# Altium footprint library UP-ROBOT Connectors(2013-02-26).PcbLib: 121 footprints (part 3 of 8)
Each footprint in its own frame and in the unit in brackets; x right, y up, seen from the top. Pads: shape width x height; smd on the part's side, far side on the other; paste and mask are expansions set on the pad; w line width, h text height; cw(c..) or ccw(c..) is an arc to the next point about the centre after c.
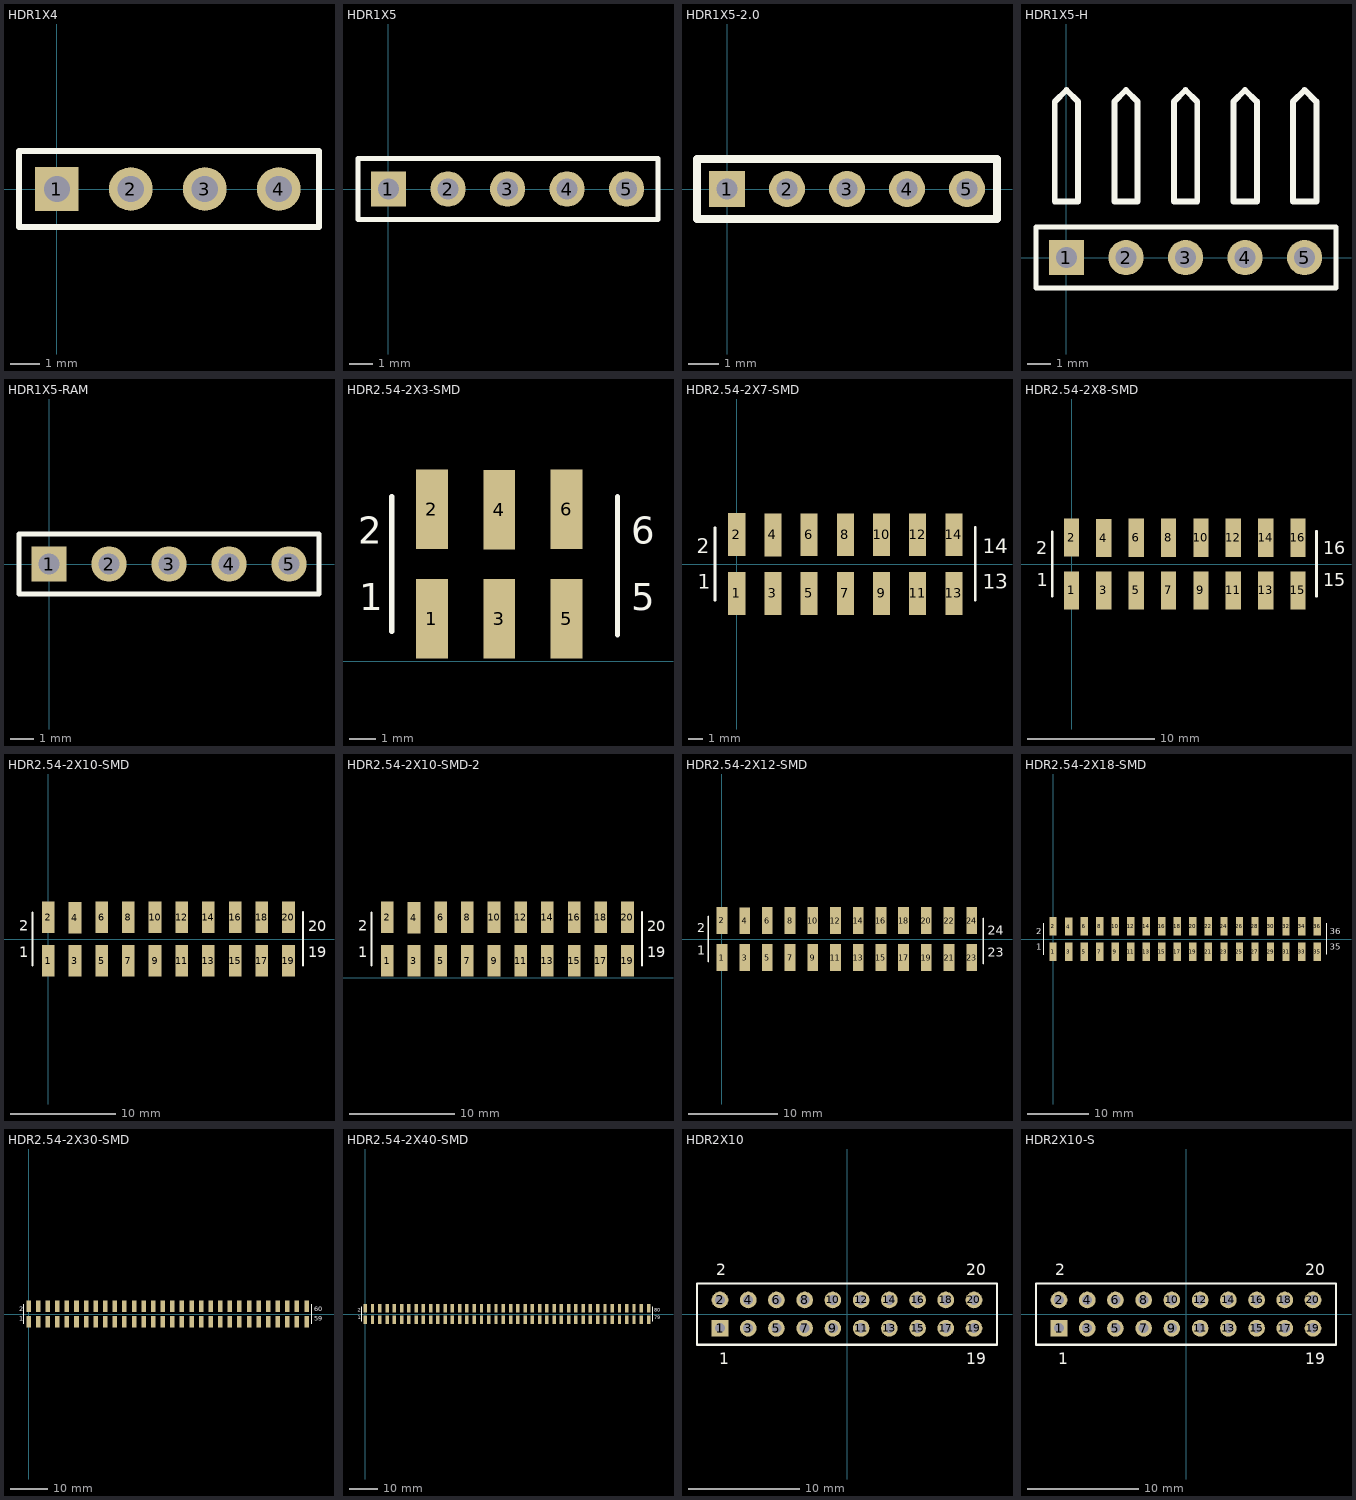
[diagram p2: the footprints below, top view; thin cyan lines are the x and y axes]

## HDR1X4 [mm]
pads (4):
  rect 1.5x1.5 hole 0.9: 1(0,0)
  round 1.5 hole 0.9: 2(2.54,0) 3(5.08,0) 4(7.62,0)
Top Overlay:
  lines w0.203: -1.3,-1.3 -1.3,1.3 9,1.3 9,-1.3 -1.3,-1.3

## HDR1X5 [mm]
pads (5):
  rect 1.5x1.5 hole 0.9: 1(0,0)
  round 1.5 hole 0.9: 2(2.54,0) 3(5.08,0) 4(7.62,0) 5(10.16,0)
Top Overlay:
  lines w0.203: -1.3,-1.3 -1.3,1.3 11.5,1.3 11.5,-1.3 -1.3,-1.3
3D body: height 9.04, standoff -3, extent -1.2,-1.2 11.5,1.34

## HDR1X5-2.0 [mm]
pads (5):
  rect 1.2x1.2 hole 0.7: 1(0,0)
  round 1.2 hole 0.7: 2(2,0) 3(4,0) 4(6,0) 5(8,0)
Top Overlay:
  lines w0.254: -1,-1 -1,1 9,1 9,-1 -1,-1

## HDR1X5-H [mm]
pads (5):
  rect 1.5x1.5 hole 0.9: 1(0,0)
  round 1.5 hole 0.9: 2(2.54,0) 3(5.08,0) 4(7.62,0) 5(10.16,0)
Top Overlay:
  lines w0.203: -1.3,-1.3 -1.3,1.3 11.5,1.3 11.5,-1.3 -1.3,-1.3
  lines w0.254: -0.5,2.4 0.5,2.4 0.5,6.65 0,7.15 -0.5,6.65 -0.5,2.4 ; 2.04,2.4 3.04,2.4 3.04,6.65 2.54,7.15 2.04,6.65 2.04,2.4 ; 4.58,2.4 5.58,2.4 5.58,6.65 5.08,7.15 4.58,6.65 4.58,2.4 ; 7.12,2.4 8.12,2.4 8.12,6.65 7.62,7.15 7.12,6.65 7.12,2.4 ; 9.66,2.4 9.66,6.65 10.16,7.15 10.66,6.65 10.66,2.4 9.66,2.4
3D body: height 4.7, standoff -3, extent -1.225,-1.275 11.475,6.995

## HDR1X5-RAM [mm]
pads (5):
  rect 1.5x1.5 hole 0.9: 1(0,0)
  round 1.5 hole 0.9: 2(2.54,0) 3(5.08,0) 4(7.62,0) 5(10.16,0)
Top Overlay:
  lines w0.2: -1.27,-1.27 11.43,-1.27 11.43,1.27 -1.27,1.27 -1.27,-1.27
3D body: height 2.51, standoff -3, extent -1.28,-0.31 11.42,9.82

## HDR2.54-2X3-SMD [mm]
pads (6):
  rect 1.2x3 smd: 1(20,1.6) 2(20,5.74) 3(22.54,1.6) 4(22.54,5.71) 5(25.08,1.6) 6(25.08,5.73)
Top Overlay:
  lines w0.2: 18.48,1.13 18.48,6.21 ; 27,1 27,6.21
  text "5" at 27.515,1.92 h1.02
  text "6" at 27.515,4.432 h1.02
  text "2" at 17.21,4.432 h1.02
  text "1" at 17.25,1.92 h1.02

## HDR2.54-2X7-SMD [mm]
pads (14):
  rect 1.2x3 smd: 1(0,-2.07) 2(0,2.07) 3(2.54,-2.07) 4(2.54,2.04) 5(5.08,-2.07) 6(5.08,2.06) 7(7.62,-2.07) 8(7.62,2.06) 9(10.16,-2.07) 10(10.16,2.06) 11(12.7,-2.07) 12(12.7,2.06) 13(15.24,-2.07) 14(15.24,2.06)
Top Overlay:
  lines w0.2: -1.52,-2.54 -1.52,2.54 ; 16.735,-2.515 16.735,2.565
  text "13" at 17.25,-1.75 h1.02
  text "14" at 17.25,0.75 h1.02
  text "1" at -2.75,-1.75 h1.02
  text "2" at -2.79,0.762 h1.02

## HDR2.54-2X8-SMD [mm]
pads (16):
  rect 1.2x3 smd: 1(0,-2.07) 2(0,2.07) 3(2.54,-2.07) 4(2.54,2.04) 5(5.08,-2.07) 6(5.08,2.06) 7(7.62,-2.07) 8(7.62,2.06) 9(10.16,-2.07) 10(10.16,2.06) 11(12.7,-2.07) 12(12.7,2.06) 13(15.24,-2.07) 14(15.24,2.06) 15(17.78,-2.07) 16(17.78,2.06)
Top Overlay:
  lines w0.2: -1.52,-2.54 -1.52,2.54 ; 19.235,-2.515 19.235,2.565
  text "16" at 19.75,0.75 h1.02
  text "15" at 19.75,-1.75 h1.02
  text "1" at -2.75,-1.75 h1.02
  text "2" at -2.79,0.762 h1.02

## HDR2.54-2X10-SMD [mm]
pads (20):
  rect 1.2x3 smd: 1(0,-2.07) 2(0,2.07) 3(2.54,-2.07) 4(2.54,2.04) 5(5.08,-2.07) 6(5.08,2.06) 7(7.62,-2.07) 8(7.62,2.06) 9(10.16,-2.07) 10(10.16,2.06) 11(12.7,-2.07) 12(12.7,2.06) 13(15.24,-2.07) 14(15.24,2.06) 15(17.78,-2.07) 16(17.78,2.06) 17(20.32,-2.07) 18(20.32,2.06) 19(22.86,-2.07) 20(22.86,2.06)
Top Overlay:
  lines w0.2: -1.52,-2.54 -1.52,2.54 ; 24.235,-2.515 24.235,2.565
  text "19" at 24.75,-1.75 h1.02
  text "20" at 24.75,0.75 h1.02
  text "2" at -2.79,0.762 h1.02
  text "1" at -2.75,-1.75 h1.02

## HDR2.54-2X10-SMD-2 [mm]
pads (20):
  rect 1.2x3 smd: 1(16,1.63) 2(16,5.77) 3(18.54,1.63) 4(18.54,5.74) 5(21.08,1.63) 6(21.08,5.76) 7(23.62,1.63) 8(23.62,5.76) 9(26.16,1.63) 10(26.16,5.76) 11(28.7,1.63) 12(28.7,5.76) 13(31.24,1.63) 14(31.24,5.76) 15(33.78,1.63) 16(33.78,5.76) 17(36.32,1.63) 18(36.32,5.76) 19(38.86,1.63) 20(38.86,5.76)
Top Overlay:
  lines w0.2: 14.48,1.16 14.48,6.24 ; 40.235,1.185 40.235,6.265
  text "1" at 13.25,1.95 h1.02
  text "2" at 13.21,4.462 h1.02
  text "20" at 40.75,4.45 h1.02
  text "19" at 40.75,1.95 h1.02

## HDR2.54-2X12-SMD [mm]
pads (24):
  rect 1.2x3 smd: 1(0,-2.07) 2(0,2.07) 3(2.54,-2.07) 4(2.54,2.04) 5(5.08,-2.07) 6(5.08,2.06) 7(7.62,-2.07) 8(7.62,2.06) 9(10.16,-2.07) 10(10.16,2.06) 11(12.7,-2.07) 12(12.7,2.06) 13(15.24,-2.07) 14(15.24,2.06) 15(17.78,-2.07) 16(17.78,2.06) 17(20.32,-2.07) 18(20.32,2.06) 19(22.86,-2.07) 20(22.86,2.06) 21(25.4,-2.07) 22(25.4,2.06) 23(27.94,-2.07) 24(27.94,2.06)
Top Overlay:
  lines w0.2: -1.52,-2.54 -1.52,2.54 ; 29.235,-2.765 29.235,2.315
  text "24" at 29.75,0.5 h1.02
  text "23" at 29.75,-2 h1.02
  text "2" at -2.79,0.762 h1.02
  text "1" at -2.75,-1.75 h1.02

## HDR2.54-2X18-SMD [mm]
pads (36):
  rect 1.2x3 smd: 1(0,-2.07) 2(0,2.07) 3(2.54,-2.07) 4(2.54,2.04) 5(5.08,-2.07) 6(5.08,2.06) 7(7.62,-2.07) 8(7.62,2.06) 9(10.16,-2.07) 10(10.16,2.06) 11(12.7,-2.07) 12(12.7,2.06) 13(15.24,-2.07) 14(15.24,2.06) 15(17.78,-2.07) 16(17.78,2.06) 17(20.32,-2.07) 18(20.32,2.06) 19(22.86,-2.07) 20(22.86,2.06) 21(25.4,-2.07) 22(25.4,2.06) 23(27.94,-2.07) 24(27.94,2.06) 25(30.48,-2.07) 26(30.48,2.06) 27(33.02,-2.07) 28(33.02,2.06) 29(35.56,-2.07) 30(35.56,2.06) 31(38.1,-2.07) 32(38.1,2.06) 33(40.64,-2.07) 34(40.64,2.06) 35(43.18,-2.07) 36(43.18,2.06)
Top Overlay:
  lines w0.2: -1.52,-2.54 -1.52,2.54 ; 44.735,-2.515 44.735,2.565
  text "35" at 45.25,-1.75 h1.02
  text "36" at 45.25,0.75 h1.02
  text "2" at -2.79,0.762 h1.02
  text "1" at -2.75,-1.75 h1.02

## HDR2.54-2X30-SMD [mm]
pads (60):
  rect 1.2x3 smd: 1(0,-2.07) 2(0,2.07) 3(2.54,-2.07) 4(2.54,2.04) 5(5.08,-2.07) 6(5.08,2.06) 7(7.62,-2.07) 8(7.62,2.06) 9(10.16,-2.07) 10(10.16,2.06) 11(12.7,-2.07) 12(12.7,2.06) 13(15.24,-2.07) 14(15.24,2.06) 15(17.78,-2.07) 16(17.78,2.06) 17(20.32,-2.07) 18(20.32,2.06) 19(22.86,-2.07) 20(22.86,2.06) 21(25.4,-2.07) 22(25.4,2.06) 23(27.94,-2.07) 24(27.94,2.06) 25(30.48,-2.07) 26(30.48,2.06) 27(33.02,-2.07) 28(33.02,2.06) 29(35.56,-2.07) 30(35.56,2.06) 31(38.1,-2.07) 32(38.1,2.06) 33(40.64,-2.07) 34(40.64,2.06) 35(43.18,-2.07) 36(43.18,2.06) 37(45.72,-2.07) 38(45.72,2.06) 39(48.26,-2.07) 40(48.26,2.06) 41(50.8,-2.07) 42(50.8,2.06) 43(53.34,-2.07) 44(53.34,2.06) 45(55.88,-2.07) 46(55.88,2.06) 47(58.42,-2.07) 48(58.42,2.06) 49(60.96,-2.07) 50(60.96,2.06) 51(63.5,-2.07) 52(63.5,2.06) 53(66.04,-2.07) 54(66.04,2.06) 55(68.58,-2.07) 56(68.58,2.06) 57(71.12,-2.07) 58(71.12,2.06) 59(73.66,-2.07) 60(73.66,2.06)
Top Overlay:
  lines w0.2: -1.27,-2.54 -1.27,2.54 ; 75.06,-2.54 75.06,2.54
  text "2" at -2.54,0.762 h1.27
  text "1" at -2.54,-1.778 h1.27
  text "59" at 75.692,-1.778 h1.27
  text "60" at 75.692,0.762 h1.27

## HDR2.54-2X40-SMD [mm] "SOIC, 16-Leads, Body 10.6x7.7mm (max), Pitch 1.27mm, IPC Medium Density"
height 3.632
pads (80):
  rect 1.2x3 smd: 1(0,-2.07) 2(0,2.07) 3(2.54,-2.07) 4(2.54,2.04) 5(5.08,-2.07) 6(5.08,2.06) 7(7.62,-2.07) 8(7.62,2.06) 9(10.16,-2.07) 10(10.16,2.06) 11(12.7,-2.07) 12(12.7,2.06) 13(15.24,-2.07) 14(15.24,2.06) 15(17.78,-2.07) 16(17.78,2.06) 17(20.32,-2.07) 18(20.32,2.06) 19(22.86,-2.07) 20(22.86,2.06) 21(25.4,-2.07) 22(25.4,2.06) 23(27.94,-2.07) 24(27.94,2.06) 25(30.48,-2.07) 26(30.48,2.06) 27(33.02,-2.07) 28(33.02,2.06) 29(35.56,-2.07) 30(35.56,2.06) 31(38.1,-2.07) 32(38.1,2.06) 33(40.64,-2.07) 34(40.64,2.06) 35(43.18,-2.07) 36(43.18,2.06) 37(45.72,-2.07) 38(45.72,2.06) 39(48.26,-2.07) 40(48.26,2.06) 41(50.8,-2.07) 42(50.8,2.06) 43(53.34,-2.07) 44(53.34,2.06) 45(55.88,-2.07) 46(55.88,2.06) 47(58.42,-2.07) 48(58.42,2.06) 49(60.96,-2.07) 50(60.96,2.06) 51(63.5,-2.07) 52(63.5,2.06) 53(66.04,-2.07) 54(66.04,2.06) 55(68.58,-2.07) 56(68.58,2.06) 57(71.12,-2.07) 58(71.12,2.06) 59(73.66,-2.07) 60(73.66,2.06) 61(76.2,-2.07) 62(76.2,2.06) 63(78.74,-2.07) 64(78.74,2.06) 65(81.28,-2.07) 66(81.28,2.06) 67(83.82,-2.07) 68(83.82,2.06) 69(86.36,-2.07) 70(86.36,2.06) 71(88.9,-2.07) 72(88.9,2.06) 73(91.44,-2.07) 74(91.44,2.06) 75(93.98,-2.07) 76(93.98,2.06) 77(96.52,-2.07) 78(96.52,2.06) 79(99.06,-2.07) 80(99.06,2.06)
Top Overlay:
  lines w0.2: -1.27,-2.54 -1.27,2.54 ; 100.46,-2.54 100.46,2.54
  text "80" at 101.092,0.762 h1.27
  text "79" at 101.092,-1.778 h1.27
  text "2" at -2.54,0.762 h1.27
  text "1" at -2.54,-1.778 h1.27

## HDR2X10 [mm]
pads (20):
  rect 1.5x1.5 hole 0.9: 1(-11.43,-1.27)
  round 1.5 hole 0.9: 2(-11.43,1.27) 3(-8.89,-1.27) 4(-8.89,1.27) 5(-6.35,-1.27) 6(-6.35,1.27) 7(-3.81,-1.27) 8(-3.81,1.27) 9(-1.27,-1.27) 10(-1.27,1.27) 11(1.27,-1.27) 12(1.27,1.27) 13(3.81,-1.27) 14(3.81,1.27) 15(6.35,-1.27) 16(6.35,1.27) 17(8.89,-1.27) 18(8.89,1.27) 19(11.43,-1.27) 20(11.43,1.27)
Top Overlay:
  lines w0.203: -13.5,-2.75 -13.5,2.75 0,2.75 13.5,2.75 13.5,-2.75 -13.5,-2.75
  text "1" at -11.5,-4.5 h1.02
  text "19" at 10.75,-4.5 h1.02
  text "20" at 10.75,3.5 h1.02
  text "2" at -11.75,3.5 h1.02
3D body: height 9.04, standoff -3, extent -12.7,-2.58 12.7,2.5

## HDR2X10-S [mm]
pads (20):
  rect 1.5x1.5 hole 0.9: 1(-11.43,-1.27)
  round 1.5 hole 0.9: 2(-11.43,1.27) 3(-8.89,-1.27) 4(-8.89,1.27) 5(-6.35,-1.27) 6(-6.35,1.27) 7(-3.81,-1.27) 8(-3.81,1.27) 9(-1.27,-1.27) 10(-1.27,1.27) 11(1.27,-1.27) 12(1.27,1.27) 13(3.81,-1.27) 14(3.81,1.27) 15(6.35,-1.27) 16(6.35,1.27) 17(8.89,-1.27) 18(8.89,1.27) 19(11.43,-1.27) 20(11.43,1.27)
Top Overlay:
  lines w0.203: -13.5,-2.75 13.5,-2.75 13.5,2.75 0,2.75 -13.5,2.75 -13.5,-2.75
  text "2" at -11.75,3.5 h1.02
  text "20" at 10.75,3.5 h1.02
  text "19" at 10.75,-4.5 h1.02
  text "1" at -11.5,-4.5 h1.02
3D body: height 8.02, standoff -3.18, extent -12.7,-2.58 12.7,2.5